# Altium footprint library LimeMicroAltiumLib_pcbLib.PcbLib: 212 footprints (part 3 of 14)
Each footprint in its own frame and in the unit in brackets; x right, y up, seen from the top. Pads: shape width x height; smd on the part's side, far side on the other; paste and mask are expansions set on the pad; w line width, h text height; cw(c..) or ccw(c..) is an arc to the next point about the centre after c.
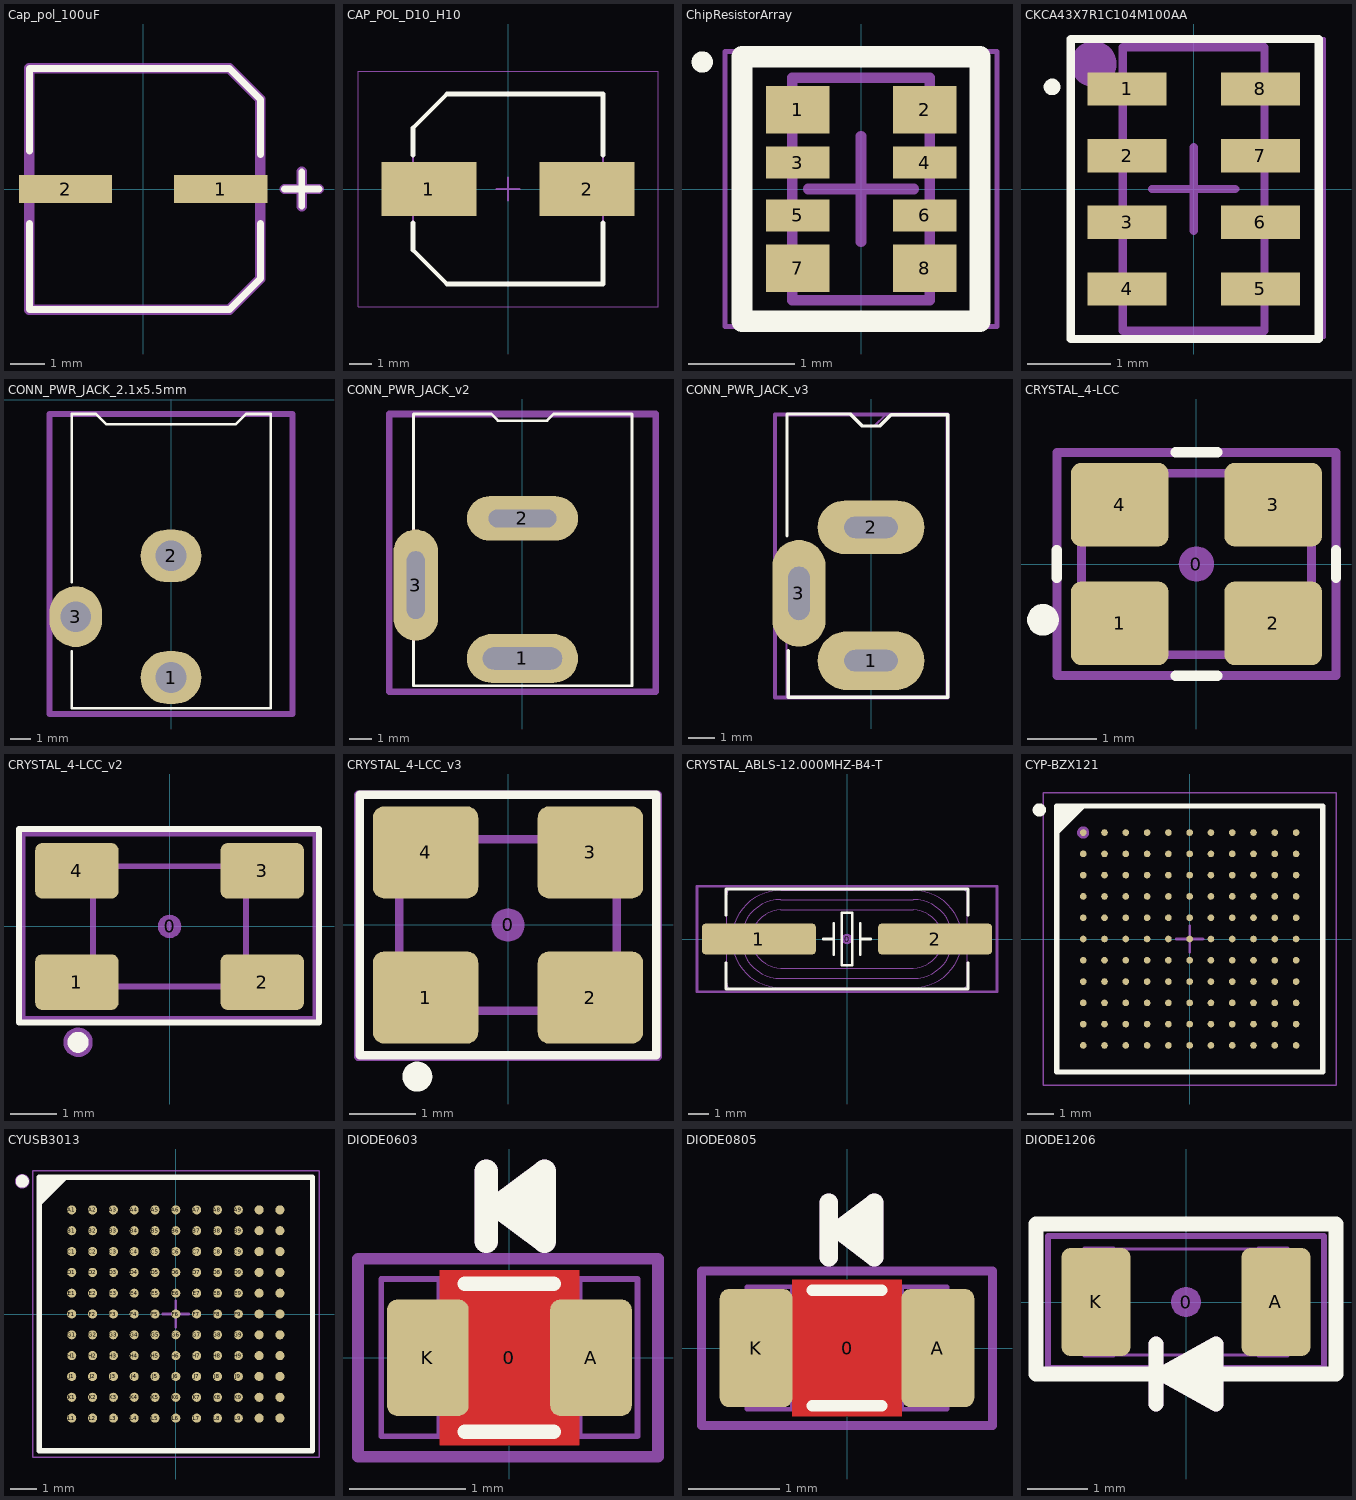
[diagram p2: the footprints below, top view; thin cyan lines are the x and y axes]

## Cap_pol_100uF [mm]
pads (2):
  rect 2.7x0.8 smd: 1(2.25,0) 2(-2.25,0)
Top Overlay:
  lines w0.2: -3.3,-1 -3.3,-3.5 2.5,-3.5 3.4,-2.6 3.4,-1 ; -3.3,1.1 -3.3,3.5 2.5,3.5 3.4,2.6 3.4,1 ; 4.1,0 5.1,0 ; 4.6,-0.5 4.6,0.5
Mechanical 15:
  lines w0.3: 4.1,0 5.1,0 ; 4.6,-0.5 4.6,0.5 ; -3.3,-3.5 2.5,-3.5 3.4,-2.6 3.4,2.6 2.5,3.5 -3.3,3.5 -3.3,-1 -3.3,-3.5
  text ".Designator" at 0,0 h0.7

## CAP_POL_D10_H10 [mm] "Aluminum Electrolytic Capacitor, Body 8,30x8,30x10,50mm, IPC Low Density"
height 10.5
pads (2):
  rect 4.15x2.35 smd: 1(-3.45,0) 2(3.45,0)
Top Overlay:
  lines w0.2: -4.15,-1.475 -4.15,-2.663 -2.663,-4.15 4.15,-4.15 4.15,-1.475 ; -4.15,1.475 -4.15,2.662 -2.663,4.15 4.15,4.15 4.15,1.475
Mechanical 13:
  lines w0.1: -4.15,-2.663 -2.663,-4.15 4.15,-4.15 4.15,4.15 -2.663,4.15 -4.15,2.662 -4.15,-2.663
Mechanical 15:
  lines w0.05: -6.55,-5.15 -6.55,5.15 6.55,5.15 6.55,-5.15 -6.55,-5.15
  lines w0.1: -0.5,0 0.5,0 ; 0,-0.5 0,0.5
  text ".Designator" at 0,0 h0.7
3D body: height 3.5, standoff 0, extent -4.15,-4.15 4.15,4.15
3D body: height 10.5, standoff 0, extent -4,-4 3.968,3.984

## ChipResistorArray [mm] "Chip Array, Flat, 8-Leads, Pitch 0,60mm,  Body 2,05x1,05mm,  IPC Medium Density"
height 0.5
pads (8):
  rect 0.6x0.45 smd mask+0.05: 1(-0.6,0.75) 2(0.6,0.75) 7(-0.6,-0.75) 8(0.6,-0.75)
  rect 0.6x0.3 smd mask+0.05: 3(-0.6,0.25) 4(0.6,0.25) 5(-0.6,-0.25) 6(0.6,-0.25)
Top Overlay:
  circle w0.1: c-1.5,1.2 r0.05
  lines w0.2: -1.125,-1.25 -1.125,1.25 1.125,1.25 1.125,-1.25 -1.125,-1.25
Mechanical 13:
  lines w0.1: -0.65,-1.05 -0.65,1.05 0.65,1.05 0.65,-1.05 -0.65,-1.05
Mechanical 15:
  lines w0.05: -1.285,-1.3 -1.285,1.3 1.285,1.3 1.285,-1.3 -1.285,-1.3
  lines w0.1: -0.5,0 0.5,0 ; 0,-0.5 0,0.5
  text ".Designator" at 0,0 h0.7
3D body "User Library-CAT10-103.STEP": height 0.4, standoff 0, extent -0.525,-1.025 0.475,0.975

## CKCA43X7R1C104M100AA [mm]
height 1
pads (8):
  rect 0.95x0.4 smd: 1(-0.8,1.2) 2(-0.8,0.4) 3(-0.8,-0.4) 4(-0.8,-1.2) 5(0.8,-1.2) 6(0.8,-0.4) 7(0.8,0.4) 8(0.8,1.2)
Top Overlay:
  circle w0.1: c-1.7,1.225 r0.05
  lines w0.1: -1.475,-1.8 1.5,-1.8 1.5,1.8 -1.475,1.8 -1.475,-1.8
Mechanical 13:
  lines w0.1: -0.85,-1.7 -0.85,1.7 0.85,1.7 0.85,-1.7 -0.85,-1.7
Mechanical 15:
  circle w0.35: c-1.2,1.5 r0.1
  lines w0.05: -1.475,-1.775 -1.475,1.8 1.565,1.8 1.565,-1.775 -1.475,-1.775
  lines w0.1: -0.5,0 0.5,0 ; 0,-0.5 0,0.5
  text ".Designator" at 0,0 h0.7
3D body "User Library-TC164.step": height 0.55, standoff 0, extent -0.8,-1.6 0.8,1.6

## CONN_PWR_JACK_2.1x5.5mm [mm] "Power Connector, 2.1mm ID, 5.5mm OD"
height 11
pads (3):
  oval 3x2.6 hole 1.511: 1(0,-13.7) 2(0,-7.7)
  oval 2.6x3 hole 1.511: 3(-4.7,-10.7)
Top Overlay:
  lines w0.127: -4.9,-12.4 -4.9,-15.225 4.925,-15.225 4.925,-0.7 3.7,-0.7 3.2,-1.2 -3.2,-1.2 -3.7,-0.7 -4.9,-0.7 -4.9,-9
Mechanical 13:
  lines w0.076: -4.9,-12.4 -4.9,-15.225 4.925,-15.225 4.925,-0.7 3.7,-0.7 3.2,-1.2 -3.2,-1.2 -3.7,-0.7 -4.9,-0.7 -4.9,-9
Mechanical 15:
  lines w0.3: -6,-15.5 6,-15.5 6,-0.7 -6,-0.7 -6,-15.5
  text ".Designator" at 0,-7.7 h0.7
3D body "3100-522 Connector.stp": height 11, standoff -3.5, extent -4.9,-14.1 4.5,0

## CONN_PWR_JACK_v2 [mm] "Power Connector, 2.1mm ID, 5.5mm OD"
height 11
pads (3):
  oval 5x2.2 hole 1 slot 3.56 at 0 deg: 1(0,-14)
  oval 5x2 hole 0.8 slot 3.05 at 0 deg: 2(0,-7.7)
  oval 2x5 hole 0.8 slot 3.05 at 90 deg: 3(-4.8,-10.7)
Top Overlay:
  lines w0.127: -4.9,-12.4 -4.9,-15.225 4.925,-15.225 4.925,-3 1.4,-3 1.1,-3.3 -1.1,-3.3 -1.4,-3 -4.9,-3 -4.9,-9
Mechanical 13:
  lines w0.076: -4.9,-12.4 -4.9,-15.225 4.925,-15.225 4.925,-3 1.4,-3 1.1,-3.3 -1.1,-3.3 -1.4,-3 -4.9,-3 -4.9,-9
Mechanical 15:
  lines w0.3: -6,-15.5 -6,-3 6,-3 6,-15.5 -6,-15.5
  text ".Designator" at -0.1,-9 h0.7
3D body "3100-522 Connector.stp": height 11, standoff -3.5, extent -4.9,-14.1 4.5,0

## CONN_PWR_JACK_v3 [mm]
height 7.4
pads (3):
  oval 4x2.2 hole 0.8 slot 2 at 0 deg: 1(0,-13.675)
  oval 4x2 hole 0.8 slot 2 at 0 deg: 2(0,-8.675)
  oval 2x4 hole 0.8 slot 2 at 90 deg: 3(-2.7,-11.15)
Top Overlay:
  lines w0.127: -3.15,-9 -3.15,-4.425 -0.775,-4.425 -0.325,-4.875 0.325,-4.875 0.75,-4.45 2.875,-4.45 2.875,-15.05 -3.1,-15.05 -3.1,-13.3
Mechanical 13:
  lines w0.076: -3.175,-12.4 -3.175,-15.05 2.9,-15.05 2.9,-4.45 0.55,-4.45 0.125,-4.875 -0.325,-4.875 -0.775,-4.425 -3.15,-4.425 -3.15,-9
Mechanical 15:
  lines w0.15: -3.6,-15.05 -3.6,-4.45 2.875,-4.45 2.875,-15.05 -3.6,-15.05
  text ".Designator" at -0.1,-9 h0.7
3D body "pj-031dh.stp": height 7.4, standoff -3.2, extent -2.85,-14.025 2.55,-2.425

## CRYSTAL_4-LCC [mm] "SMD Crystal 4-lead leadless package"
height 0.8
pads (5):
  round 0.508 on Mech15: 0(0,0)
  rrect25% 1.4x1.2 smd: 1(-1.1,-0.85) 2(1.1,-0.85) 3(1.1,0.85) 4(-1.1,0.85)
Top Overlay:
  circle w0.254: c-2.2,-0.8 r0.1
  lines w0.15: -2,-0.2 -2,0.2 ; -0.3,-1.6 0.3,-1.6 ; -0.3,1.6 0.3,1.6 ; 2,-0.2 2,0.2
Mechanical 13:
  lines w0.127: -1.65,-1.143 -1.493,-1.3 1.493,-1.3 1.65,-1.143 1.65,1.144 1.494,1.3 -1.493,1.3 -1.65,1.143 -1.65,-1.143
Mechanical 15:
  circle w0.35: c-1.4,-1.1 r0.141
  lines w0.127: -2,-1.6 2,-1.6 2,1.6 -2,1.6 -2,-1.6
  text ".Designator" at 0,0 h0.7
3D body "Crystal TXC Corp 7M series.STEP": height 0.8, standoff 0, extent -1.65,-1.3 1.65,1.3

## CRYSTAL_4-LCC_v2 [mm] "SMD Crystal 4-lead leadless package"
height 0.8
pads (5):
  round 0.508 on Mech15: 0(0,0)
  rrect25% 1.8x1.2 smd: 1(-2,-1.2) 2(2,-1.2) 3(2,1.2) 4(-2,1.2)
Top Overlay:
  circle w0.254: c-1.975,-2.5 r0.1
  lines w0.127: -3.25,-2.075 -3.25,2.1 3.225,2.1 3.225,-2.075 -3.25,-2.075
Mechanical 13:
  lines w0.127: -1.65,-1.143 -1.493,-1.3 1.493,-1.3 1.65,-1.143 1.65,1.144 1.494,1.3 -1.493,1.3 -1.65,1.143 -1.65,-1.143
Mechanical 15:
  circle w0.35: c-1.975,-2.5 r0.141
  lines w0.127: -3.175,-2 3.15,-2 3.15,2 -3.175,2 -3.175,-2
  text ".Designator" at 0,0 h0.7
3D body "Crystal TXC Corp 7M series.STEP": height 0.8, standoff 0, extent -1.65,-1.3 1.65,1.3

## CRYSTAL_4-LCC_v3 [mm] "SMD Crystal 4-lead leadless package"
height 0.8
pads (5):
  round 0.508 on Mech15: 0(0,0)
  rrect25% 1.6x1.4 smd: 1(-1.25,-1.1) 2(1.25,-1.1) 3(1.25,1.1) 4(-1.25,1.1)
Top Overlay:
  circle w0.254: c-1.375,-2.3 r0.1
  lines w0.127: -2.25,-1.975 -2.25,1.975 2.25,1.975 2.25,-1.975 -2.25,-1.975
Mechanical 13:
  lines w0.127: -1.65,-1.143 -1.493,-1.3 1.493,-1.3 1.65,-1.143 1.65,1.144 1.494,1.3 -1.493,1.3 -1.65,1.143 -1.65,-1.143
Mechanical 15:
  circle w0.35: c-1.5,-1.3 r0.141
  lines w0.127: -2.275,-2 2.275,-2 2.275,1.975 -2.275,1.975 -2.275,-2
  text ".Designator" at 0,0 h0.7
3D body "Crystal TXC Corp 7M series.STEP": height 0.8, standoff 0, extent -1.65,-1.3 1.65,1.3

## CRYSTAL_ABLS-12.000MHZ-B4-T [mm] "SMD Crystal ABLS-12.000MHZ-B4-T package"
height 4.3
pads (3):
  round 0.508 on Mech14: 0(0,0)
  rrect25% 5.5x1.5 smd: 1(-4.25,0) 2(4.25,0)
Top Overlay:
  lines w0.127: -5.842,-1.143 -5.842,-2.413 5.842,-2.413 5.842,-1.143 ; -5.842,1.143 -5.842,2.413 5.842,2.413 5.842,1.143 ; -1.143,0 -0.635,0 ; -0.635,-0.762 -0.635,0.762 ; 0.635,-0.762 0.635,0.762 ; 0.635,0 1.143,0 ; -0.254,-1.27 -0.254,1.27 0.254,1.27 0.254,-1.27 -0.254,-1.27
Mechanical 13:
  lines w0.05: -5.8,-0.45 -6.4,-0.45 -6.4,0.45 -5.8,0.45 ; 5.8,-0.45 6.4,-0.45 6.4,0.45 5.8,0.45 ; -5.8,-2.165 ccw(c-5.55,-2.165) -5.55,-2.415 5.55,-2.415 ccw(c5.55,-2.165) 5.8,-2.165 5.8,2.165 ccw(c5.55,2.165) 5.55,2.415 -5.55,2.415 ccw(c-5.55,2.165) -5.8,2.165 -5.8,-2.165 ; -3.2,-2.35 cw(c-3.2,0) -3.2,2.35 3.2,2.35 cw(c3.2,0) 3.2,-2.35 -3.2,-2.35 ; -3.2,-1.9 cw(c-3.2,0) -3.2,1.9 3.2,1.9 cw(c3.2,0) 3.2,-1.9 -3.2,-1.9 ; -3.2,-1.4 cw(c-3.2,0) -3.2,1.4 3.2,1.4 cw(c3.2,0) 3.2,-1.4 -3.2,-1.4
Mechanical 14:
  lines w0.127: -7.239,-2.54 -7.239,2.54 7.239,2.54 7.239,-2.54 -7.239,-2.54
3D body "Crystal HC49_US-SM.STEP": height 4.29, standoff -0.01, extent -6.4,-2.415 6.4,2.415

## CYP-BZX121 [mm] "BGA, 121-Balls, Body 10x10mm, Pitch 0.8mm"
height 1.2
pads (121):
  round 0.25 smd: A1(-4,4) A2(-3.2,4) A3(-2.4,4) A4(-1.6,4) A5(-0.8,4) A6(0,4) A7(0.8,4) A8(1.6,4) A9(2.4,4) A10(3.2,4) A11(4,4) B1(-4,3.2) B2(-3.2,3.2) B3(-2.4,3.2) B4(-1.6,3.2) B5(-0.8,3.2) B6(0,3.2) B7(0.8,3.2) B8(1.6,3.2) B9(2.4,3.2) B10(3.2,3.2) B11(4,3.2) C1(-4,2.4) C2(-3.2,2.4) C3(-2.4,2.4) C4(-1.6,2.4) C5(-0.8,2.4) C6(0,2.4) C7(0.8,2.4) C8(1.6,2.4) C9(2.4,2.4) C10(3.2,2.4) C11(4,2.4) D1(-4,1.6) D2(-3.2,1.6) D3(-2.4,1.6) D4(-1.6,1.6) D5(-0.8,1.6) D6(0,1.6) D7(0.8,1.6) D8(1.6,1.6) D9(2.4,1.6) D10(3.2,1.6) D11(4,1.6) E1(-4,0.8) E2(-3.2,0.8) E3(-2.4,0.8) E4(-1.6,0.8) E5(-0.8,0.8) E6(0,0.8) E7(0.8,0.8) E8(1.6,0.8) E9(2.4,0.8) E10(3.2,0.8) E11(4,0.8) F1(-4,0) F2(-3.2,0) F3(-2.4,0) F4(-1.6,0) F5(-0.8,0) F6(0,0) F7(0.8,0) F8(1.6,0) F9(2.4,0) F10(3.2,0) F11(4,0) G1(-4,-0.8) G2(-3.2,-0.8) G3(-2.4,-0.8) G4(-1.6,-0.8) G5(-0.8,-0.8) G6(0,-0.8) G7(0.8,-0.8) G8(1.6,-0.8) G9(2.4,-0.8) G10(3.2,-0.8) G11(4,-0.8) H1(-4,-1.6) H2(-3.2,-1.6) H3(-2.4,-1.6) H4(-1.6,-1.6) H5(-0.8,-1.6) H6(0,-1.6) H7(0.8,-1.6) H8(1.6,-1.6) H9(2.4,-1.6) H10(3.2,-1.6) H11(4,-1.6) J1(-4,-2.4) J2(-3.2,-2.4) J3(-2.4,-2.4) J4(-1.6,-2.4) J5(-0.8,-2.4) J6(0,-2.4) J7(0.8,-2.4) J8(1.6,-2.4) J9(2.4,-2.4) J10(3.2,-2.4) J11(4,-2.4) K1(-4,-3.2) K2(-3.2,-3.2) K3(-2.4,-3.2) K4(-1.6,-3.2) K5(-0.8,-3.2) K6(0,-3.2) K7(0.8,-3.2) K8(1.6,-3.2) K9(2.4,-3.2) K10(3.2,-3.2) K11(4,-3.2) L1(-4,-4) L2(-3.2,-4) L3(-2.4,-4) L4(-1.6,-4) L5(-0.8,-4) L6(0,-4) L7(0.8,-4) L8(1.6,-4) L9(2.4,-4) L10(3.2,-4) L11(4,-4)
Top Overlay:
  circle w0.25: c-5.65,4.85 r0.125
  region: -4,5 -5,4 -5,5
  lines w0.2: -5,4 -4,5 ; -5,-5 5,-5 5,5 -5,5 -5,-5
Mechanical 13:
  lines w0.1: -5,-5 5,-5 5,5 -5,5 -5,-5
Mechanical 15:
  circle w0.4: c-4,4 r0.025
  lines w0.05: -5.5,-5.5 5.5,-5.5 5.5,5.5 -5.5,5.5 -5.5,-5.5
  lines w0.1: -0.5,0 0.5,0 ; 0,-0.5 0,0.5
  text ".Designator" at 0,-0.025 h0.7
3D body: height 1.3, standoff 1.2, extent -4.4,3.6 -3.6,4.4
3D body: height 1.2, standoff 0.15, extent -5,-5 5,5

## CYUSB3013 [mm] "BGA, 121-Leads, Body 10,50x10,50mmx1,10mm, Pitch 0,80mm"
height 1.1
pads (121):
  round 0.35 smd: A1(-4,4) A2(-3.2,4) A3(-2.4,4) A4(-1.6,4) A5(-0.8,4) A6(0,4) A7(0.8,4) A8(1.6,4) A9(2.4,4) A10(3.2,4) A11(4,4) B1(-4,3.2) B2(-3.2,3.2) B3(-2.4,3.2) B4(-1.6,3.2) B5(-0.8,3.2) B6(0,3.2) B7(0.8,3.2) B8(1.6,3.2) B9(2.4,3.2) B10(3.2,3.2) B11(4,3.2) C1(-4,2.4) C2(-3.2,2.4) C3(-2.4,2.4) C4(-1.6,2.4) C5(-0.8,2.4) C6(0,2.4) C7(0.8,2.4) C8(1.6,2.4) C9(2.4,2.4) C10(3.2,2.4) C11(4,2.4) D1(-4,1.6) D2(-3.2,1.6) D3(-2.4,1.6) D4(-1.6,1.6) D5(-0.8,1.6) D6(0,1.6) D7(0.8,1.6) D8(1.6,1.6) D9(2.4,1.6) D10(3.2,1.6) D11(4,1.6) E1(-4,0.8) E2(-3.2,0.8) E3(-2.4,0.8) E4(-1.6,0.8) E5(-0.8,0.8) E6(0,0.8) E7(0.8,0.8) E8(1.6,0.8) E9(2.4,0.8) E10(3.2,0.8) E11(4,0.8) F1(-4,0) F2(-3.2,0) F3(-2.4,0) F4(-1.6,0) F5(-0.8,0) F6(0,0) F7(0.8,0) F8(1.6,0) F9(2.4,0) F10(3.2,0) F11(4,0) G1(-4,-0.8) G2(-3.2,-0.8) G3(-2.4,-0.8) G4(-1.6,-0.8) G5(-0.8,-0.8) G6(0,-0.8) G7(0.8,-0.8) G8(1.6,-0.8) G9(2.4,-0.8) G10(3.2,-0.8) G11(4,-0.8) H1(-4,-1.6) H2(-3.2,-1.6) H3(-2.4,-1.6) H4(-1.6,-1.6) H5(-0.8,-1.6) H6(0,-1.6) H7(0.8,-1.6) H8(1.6,-1.6) H9(2.4,-1.6) H10(3.2,-1.6) H11(4,-1.6) J1(-4,-2.4) J2(-3.2,-2.4) J3(-2.4,-2.4) J4(-1.6,-2.4) J5(-0.8,-2.4) J6(0,-2.4) J7(0.8,-2.4) J8(1.6,-2.4) J9(2.4,-2.4) J10(3.2,-2.4) J11(4,-2.4) K1(-4,-3.2) K2(-3.2,-3.2) K3(-2.4,-3.2) K4(-1.6,-3.2) K5(-0.8,-3.2) K6(0,-3.2) K7(0.8,-3.2) K8(1.6,-3.2) K9(2.4,-3.2) K10(3.2,-3.2) K11(4,-3.2) L1(-4,-4) L2(-3.2,-4) L3(-2.4,-4) L4(-1.6,-4) L5(-0.8,-4) L6(0,-4) L7(0.8,-4) L8(1.6,-4) L9(2.4,-4) L10(3.2,-4) L11(4,-4)
Top Overlay:
  circle w0.25: c-5.9,5.1 r0.125
  region: -4.25,5.25 -5.25,4.25 -5.25,5.25
  lines w0.2: -5.25,4.25 -4.25,5.25 ; -5.25,-5.25 -5.25,5.25 5.25,5.25 5.25,-5.25 -5.25,-5.25
Mechanical 13:
  lines w0.1: -5.25,-5.25 -5.25,5.25 5.25,5.25 5.25,-5.25 -5.25,-5.25
Mechanical 15:
  circle w0.35: c-5.9,5.1 r0.1
  lines w0.05: -5.5,-5.5 -5.5,5.5 5.5,5.5 5.5,-5.5 -5.5,-5.5
  lines w0.1: -0.5,0 0.5,0 ; 0,-0.5 0,0.5
  text ".Designator" at 0,0 h0.7
3D body: height 1.1, standoff 1, extent -4.4,3.6 -3.6,4.4
3D body: height 1.1, standoff 0.25, extent -5.25,-5.25 5.25,5.25

## DIODE0603 [mm]
height 0.7
pads (3):
  round 0.254 on Mech15: 0(0,0)
  rrect25% 0.7x1 smd: A(0.7,0) K(-0.7,0)
Top Layer:
  pour cut-out: -0.6,0.75 0.6,0.75 0.6,-0.75 -0.6,-0.75
Top Overlay:
  lines w0.127: -0.381,-0.635 0.381,-0.635 ; -0.381,0.635 0.381,0.635
  lines w0.2: -0.2,1 -0.2,1.6 ; -0.1,1.3 0.3,1.3 0.3,1.6 ; -0.1,1.3 0.3,1.6 ; -0.1,1.3 0.3,1 0.3,1.6
Mechanical 13:
  lines w0.05: 0.6,-0.674 -0.6,-0.674 ; -0.6,-0.674 0.6,-0.674 ; -0.6,-0.675 -1.1,-0.675 -1.1,0.675 -0.6,0.675 -0.6,-0.675 ; 0.6,-0.675 1.1,-0.675 1.1,0.675 0.6,0.675 ; 0.6,-0.675 0.6,0.675 ; 0.6,0.674 -0.6,0.674 0.6,0.674
Mechanical 15:
  lines w0.1: -1.3,-0.85 -1.3,0.85 1.275,0.85 1.275,-0.85 -1.3,-0.85
  lines w0.2: -0.2,1 -0.2,1.6 ; -0.1,1.3 0.3,1 0.3,1.6 ; -0.1,1.3 0.3,1.6 ; -0.1,1.3 0.3,1.3 0.3,1.6
  text "C" at -1.05,-0.4 h0.9
  text "A" at 0.5,-0.375 h0.9
  text ".Designator" at 0,0 h0.7
3D body "RES 0805 (2012 metric).STEP": height 0.69, standoff -0.01, extent -1.1,-0.675 1.1,0.675

## DIODE0805 [mm] "Chip Resistor, Body 2.0x1.2mm, 0805, IPC Medium Density"
height 0.7
pads (3):
  round 0.254 on Mech15: 0(0,0)
  rrect25% 0.8x1.3 smd: A(1,0) K(-1,0)
Top Layer:
  pour cut-out: -0.6,0.75 0.6,0.75 0.6,-0.75 -0.6,-0.75
Top Overlay:
  lines w0.127: -0.381,-0.635 0.381,-0.635 ; -0.381,0.635 0.381,0.635
  lines w0.2: -0.2,1 -0.2,1.6 ; -0.1,1.3 0.3,1 0.3,1.6 ; -0.1,1.3 0.3,1.6 ; -0.1,1.3 0.3,1.3 0.3,1.6
Mechanical 13:
  lines w0.05: 0.6,-0.674 -0.6,-0.674 ; -0.6,-0.675 -0.6,0.675 -1.1,0.675 -1.1,-0.675 -0.6,-0.675 ; -0.6,-0.674 0.6,-0.674 ; 0.6,-0.675 0.6,0.675 ; 0.6,-0.675 1.1,-0.675 1.1,0.675 0.6,0.675 ; 0.6,0.674 -0.6,0.674 0.6,0.674
Mechanical 15:
  lines w0.1: -1.6,-0.85 1.6,-0.85 1.6,0.85 -1.6,0.85 -1.6,-0.85
  lines w0.2: -0.2,1 -0.2,1.6 ; -0.1,1.3 0.3,1.3 0.3,1.6 ; -0.1,1.3 0.3,1.6 ; -0.1,1.3 0.3,1 0.3,1.6
  text ".Designator" at 0,0 h0.7
  text "A" at 0.7,-0.3 h0.9
  text "C" at -1.3,-0.4 h0.9
3D body "RES 0805 (2012 metric).STEP": height 0.69, standoff -0.01, extent -1.1,-0.675 1.1,0.675

## DIODE1206 [mm]
height 1.6
pads (3):
  round 0.508 on Mech15: 0(0,0)
  rrect25% 1.15x1.8 smd: A(1.5,0) K(-1.5,0)
Top Overlay:
  lines w0.254: -0.5,-1.7 -0.5,-0.7 ; 0,-1.4 0.5,-1.4 ; 0.1,-1 0.5,-1 ; 0.5,-1.2 0.3,-1.2 -0.4,-1.2 ; -0.4,-1.2 0.5,-1.7 0.5,-0.7 -0.4,-1.2 ; -2.5,-1.2 -2.5,1.3 2.5,1.3 2.5,-1.2 -2.5,-1.2
Mechanical 13:
  lines w0.05: -1.2,-0.88 1.2,-0.88 ; -1.2,0.88 1.2,0.88 ; -1.7,-0.9 -1.7,0.9 -1.2,0.9 -1.2,-0.9 -1.7,-0.9 ; 1.2,-0.9 1.2,0.9 1.7,0.9 1.7,-0.9 1.2,-0.9
Mechanical 15:
  lines w0.1: -2.3,-1.1 2.3,-1.1 2.3,1.1 -2.3,1.1 -2.3,-1.1
  lines w0.254: -0.5,-1.7 -0.5,-0.7 ; 0,-1.4 0.5,-1.4 ; 0.1,-1 0.5,-1 ; 0.5,-1.2 0.3,-1.2 -0.4,-1.2 ; -0.4,-1.2 0.5,-0.7 0.5,-1.7 -0.4,-1.2
  text ".Designator" at 0,0 h0.7
3D body "CAP_1206.STEP": height 1.74, standoff -0.01, extent -1.7,-0.9 1.7,0.9